# Altium footprint library My Library.PcbLib: 872 footprints (part 47 of 55)
Each footprint in its own frame and in the unit in brackets; x right, y up, seen from the top. Pads: shape width x height; smd on the part's side, far side on the other; paste and mask are expansions set on the pad; w line width, h text height; cw(c..) or ccw(c..) is an arc to the next point about the centre after c.
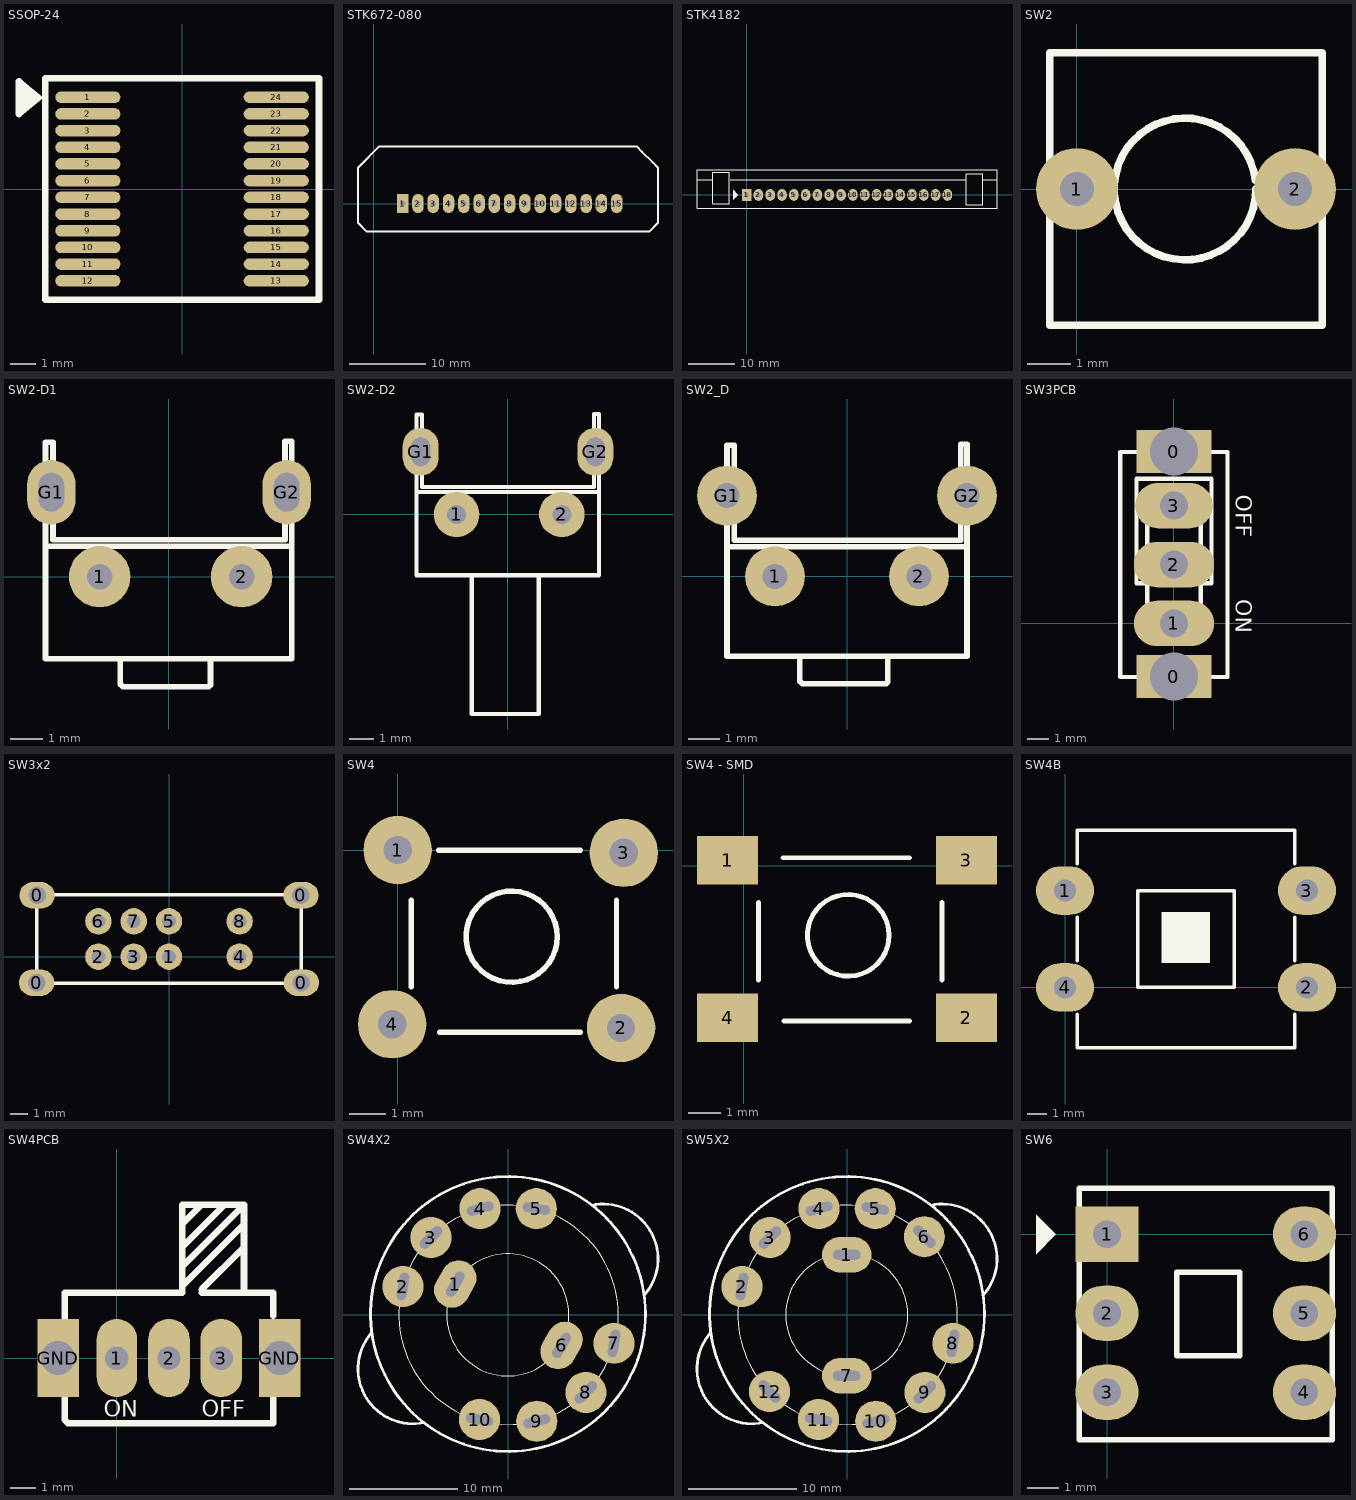
[diagram p46: the footprints below, top view; thin cyan lines are the x and y axes]

## SSOP-24 [mm]
pads (24):
  oval 2.54x0.45 smd: 1(-3.67,3.575) 2(-3.67,2.925) 3(-3.67,2.275) 4(-3.67,1.625) 5(-3.67,0.975) 6(-3.67,0.325) 7(-3.67,-0.325) 8(-3.67,-0.975) 9(-3.67,-1.625) 10(-3.67,-2.275) 11(-3.67,-2.925) 12(-3.67,-3.575) 13(3.67,-3.575) 14(3.67,-2.925) 15(3.67,-2.275) 16(3.67,-1.625) 17(3.67,-0.975) 18(3.67,-0.325) 19(3.67,0.325) 20(3.67,0.975) 21(3.67,1.625) 22(3.67,2.275) 23(3.67,2.925) 24(3.67,3.575)
Top Overlay:
  region: -5.588,3.556 -6.35,4.191 -6.35,2.921
  lines w0.254: -6.35,2.921 -5.588,3.556 -6.35,4.191 -6.35,2.921 ; -5.334,-4.318 5.334,-4.318 5.334,4.318 -5.334,4.318 -5.334,-4.318
3D body: height 2, standoff 0.05, extent -2.8,-4.25 2.8,4.25
3D body: height 1.05, standoff 0.95, extent -3.2,3.384 -2.286,3.765
3D body: height 1.05, standoff 0, extent -3.327,3.384 -3.2,3.765
3D body: height 0.1, standoff 0, extent -4.064,3.384 -3.327,3.765
3D body: height 0.1, standoff 0, extent -4.064,2.734 -3.327,3.115
3D body: height 1.05, standoff 0, extent -3.327,2.734 -3.2,3.115
3D body: height 1.05, standoff 0.95, extent -3.2,2.734 -2.286,3.115
3D body: height 0.1, standoff 0, extent -4.064,2.084 -3.327,2.465
3D body: height 1.05, standoff 0, extent -3.327,2.084 -3.2,2.465
3D body: height 1.05, standoff 0.95, extent -3.2,2.084 -2.286,2.465
3D body: height 0.1, standoff 0, extent -4.064,1.434 -3.327,1.815
3D body: height 1.05, standoff 0, extent -3.327,1.434 -3.2,1.815
3D body: height 1.05, standoff 0.95, extent -3.2,1.434 -2.286,1.815
3D body: height 0.1, standoff 0, extent -4.064,0.784 -3.327,1.165
3D body: height 1.05, standoff 0, extent -3.327,0.784 -3.2,1.165
3D body: height 1.05, standoff 0.95, extent -3.2,0.784 -2.286,1.165
3D body: height 0.1, standoff 0, extent -4.064,0.134 -3.327,0.515
3D body: height 1.05, standoff 0, extent -3.327,0.134 -3.2,0.515
3D body: height 1.05, standoff 0.95, extent -3.2,0.134 -2.286,0.515
3D body: height 0.1, standoff 0, extent -4.064,-0.516 -3.327,-0.135
3D body: height 1.05, standoff 0, extent -3.327,-0.516 -3.2,-0.135
3D body: height 1.05, standoff 0.95, extent -3.2,-0.516 -2.286,-0.135
3D body: height 0.1, standoff 0, extent -4.064,-1.165 -3.327,-0.784
3D body: height 1.05, standoff 0, extent -3.327,-1.165 -3.2,-0.784
3D body: height 1.05, standoff 0.95, extent -3.2,-1.165 -2.286,-0.784
3D body: height 0.1, standoff 0, extent -4.064,-1.816 -3.327,-1.435
3D body: height 1.05, standoff 0, extent -3.327,-1.816 -3.2,-1.435
3D body: height 1.05, standoff 0.95, extent -3.2,-1.816 -2.286,-1.435
3D body: height 0.1, standoff 0, extent -4.064,-2.466 -3.327,-2.085
3D body: height 1.05, standoff 0, extent -3.327,-2.466 -3.2,-2.085
3D body: height 1.05, standoff 0.95, extent -3.2,-2.466 -2.286,-2.085
3D body: height 0.1, standoff 0, extent -4.064,-3.116 -3.327,-2.735
3D body: height 1.05, standoff 0, extent -3.327,-3.116 -3.2,-2.735
3D body: height 1.05, standoff 0.95, extent -3.2,-3.116 -2.286,-2.735
3D body: height 0.1, standoff 0, extent -4.064,-3.765 -3.327,-3.384
3D body: height 1.05, standoff 0, extent -3.327,-3.765 -3.2,-3.384
3D body: height 1.05, standoff 0.95, extent -3.2,-3.765 -2.286,-3.384
3D body: height 1.05, standoff 0.95, extent 2.286,3.384 3.2,3.765
3D body: height 1.05, standoff 0, extent 3.2,3.384 3.327,3.765
3D body: height 0.1, standoff 0, extent 3.327,3.384 4.064,3.765
3D body: height 1.05, standoff 0.95, extent 2.286,2.735 3.2,3.116
3D body: height 1.05, standoff 0, extent 3.2,2.735 3.327,3.116
3D body: height 0.1, standoff 0, extent 3.327,2.735 4.064,3.116
3D body: height 1.05, standoff 0.95, extent 2.286,2.085 3.2,2.466
3D body: height 1.05, standoff 0, extent 3.2,2.085 3.327,2.466
3D body: height 0.1, standoff 0, extent 3.327,2.085 4.064,2.466
3D body: height 1.05, standoff 0.95, extent 2.286,1.435 3.2,1.816
3D body: height 1.05, standoff 0, extent 3.2,1.435 3.327,1.816
3D body: height 0.1, standoff 0, extent 3.327,1.435 4.064,1.816
3D body: height 1.05, standoff 0.95, extent 2.286,0.784 3.2,1.165
3D body: height 1.05, standoff 0, extent 3.2,0.784 3.327,1.165
3D body: height 0.1, standoff 0, extent 3.327,0.784 4.064,1.165
3D body: height 1.05, standoff 0.95, extent 2.286,0.135 3.2,0.516
3D body: height 1.05, standoff 0, extent 3.2,0.135 3.327,0.516
3D body: height 0.1, standoff 0, extent 3.327,0.135 4.064,0.516
3D body: height 1.05, standoff 0.95, extent 2.286,-0.515 3.2,-0.134
3D body: height 1.05, standoff 0, extent 3.2,-0.515 3.327,-0.134
3D body: height 0.1, standoff 0, extent 3.327,-0.515 4.064,-0.134
3D body: height 1.05, standoff 0.95, extent 2.286,-1.165 3.2,-0.784
3D body: height 1.05, standoff 0, extent 3.2,-1.165 3.327,-0.784
3D body: height 0.1, standoff 0, extent 3.327,-1.165 4.064,-0.784
3D body: height 1.05, standoff 0.95, extent 2.286,-1.815 3.2,-1.434
3D body: height 1.05, standoff 0, extent 3.2,-1.815 3.327,-1.434
3D body: height 0.1, standoff 0, extent 3.327,-1.815 4.064,-1.434
3D body: height 1.05, standoff 0.95, extent 2.286,-2.465 3.2,-2.084
3D body: height 1.05, standoff 0, extent 3.2,-2.465 3.327,-2.084
3D body: height 0.1, standoff 0, extent 3.327,-2.465 4.064,-2.084
3D body: height 1.05, standoff 0.95, extent 2.286,-3.115 3.2,-2.734
3D body: height 1.05, standoff 0, extent 3.2,-3.115 3.327,-2.734
3D body: height 0.1, standoff 0, extent 3.327,-3.115 4.064,-2.734
3D body: height 0.1, standoff 0, extent 3.327,-3.765 4.064,-3.384
3D body: height 1.05, standoff 0, extent 3.2,-3.765 3.327,-3.384
3D body: height 1.05, standoff 0.95, extent 2.286,-3.765 3.2,-3.384
3D body: height 2.01, standoff 0, extent -2.304,3.036 -1.286,4.054

## STK672-080 [mm]
pads (15):
  rect 1.5x2.5 / inner rect 1.2x2.5 / far side rect 1.5x2.5 hole 0.7: 1(3.81,0)
  oval 1.5x2.5 / inner oval 1.2x2.5 / far side oval 1.5x2.5 hole 0.7: 2(5.81,0) 3(7.81,0) 4(9.81,0) 5(11.81,0) 6(13.81,0) 7(15.81,0) 8(17.81,0) 9(19.81,0) 10(21.81,0) 11(23.81,0) 12(25.81,0) 13(27.81,0) 14(29.81,0) 15(31.81,0)
Top Overlay:
  lines w0.254: -2.032,-2.54 -0.889,-3.683 36.068,-3.683 37.211,-2.54 37.211,4.699 36.512,5.397 35.115,6.794 34.417,7.493 0.762,7.493 -2.032,4.699 -2.032,-2.54

## STK4182 [mil] "Pin to pin 100mil, 18 pin"
pads (18):
  rect 80x100 hole 40: 1(0,0)
  oval 80x100 hole 40: 2(100,0) 3(200,0) 4(300,0) 5(400,0) 6(500,0) 7(600,0) 8(700,0) 9(800,0) 10(900,0) 11(1000,0) 12(1100,0) 13(1200,0) 14(1300,0) 15(1400,0) 16(1500,0) 17(1600,0) 18(1700,0)
Top Overlay:
  region: -115,42.5 -115,-42.5 -75,-2.5 -75,2.5
  lines w10: -420,130 -285,130 ; -140,130 1860,130 ; 2000,130 2120,130 ; -420,-115 -420,215 2120,215 2120,-115 -420,-115 ; -285,-75 -145,-75 -145,190 -285,190 -285,-75 ; 1860,-85 1860,180 2000,180 2000,-85 1860,-85

## SW2 [mil] "SW button 2pin, 250x 250 mil"
height 100
pads (2):
  round 75 hole 31: 1(0,0) 2(200,0)
Top Overlay:
  lines w7: 163.64,8.26 ccw(c99.17,0) 164.17,0 ; -25,-125 225,-125 225,125 -25,125 -25,-125

## SW2-D1 [mil] "SW button 2pin, 300x 300 x 250 mil"
height 100
pads (4):
  round 75 hole 31: 1(-84,0) 2(89,0)
  oval 59.06x78.74 hole 31 slot 47.24 at 90 deg: G1(-143,103) G2(144,103)
Top Overlay:
  lines w7: -150,37 150,37 ; -59,-100 -59,-131 -56,-134 49,-134 51,-132 51,-100 ; -150,-100 -150,164 -141,164 -141,45 142,45 142,165 150,165 150,-100 -150,-100
3D body "19950.stp": height 291.34, standoff -137.8, extent -170.26,-123 172.26,158.5

## SW2-D2 [mil] "SW button 2pin, 300x 300 x 250 mil"
height 100
pads (4):
  round 75 hole 31: 1(-84,0) 2(89,0)
  oval 59.06x78.74 hole 31 slot 47.24 at 90 deg: G1(-143,103) G2(144,103)
Top Overlay:
  lines w7: -150,37 150,37 ; -59,-100 -59,-328 51,-328 51,-100 ; -150,-100 150,-100 150,165 142,165 142,45 -141,45 -141,164 -150,164 -150,-100
3D body "SW3dPS-Alps TACT SKHH Horizontal Switch.STEP": height 290.35, standoff -137.8, extent -162.52,-327.46 166.72,163.49

## SW2_D [mil] "SW button 2pin, 300x 300 x 250 mil"
height 100
pads (4):
  round 75 hole 31: 1(-90,0) 2(90,0) G1(-150,101) G2(150,101)
Top Overlay:
  lines w7: -150,37 150,37 ; -59,-100 -59,-131 -56,-134 49,-134 51,-132 51,-100 ; -150,-100 150,-100 150,165 142,165 142,45 -141,45 -141,164 -150,164 -150,-100

## SW3PCB [mil]
pads (5):
  rect 140x80 hole 90: 0(0,-99) 0(0,321)
  oval 150x85 hole 52: 1(0,0) 2(0,110)
  oval 145x85 hole 52: 3(0,220)
Top Overlay:
  lines w8: -70,90 70,90 ; -70,120 65,120 ; -65,105 70,105 ; -50,0 -50,220 50,220 50,0 ; -50,0 50,0 ; -50,0 50,0 ; -100,-100 -100,320 100,320 100,-100 -100,-100 ; -70,75 -70,270 70,270 70,75 -70,75
  text "OFF" at 115,240 h30
  text "ON" at 115,45 h30

## SW3x2 [mil] "Switch 3x2 - pin to pin 80"
height 500
pads (12):
  oval 80x60 hole 40: 0(-300,-59) 0(-299,139) 0(299,139) 0(300,-59)
  round 60 hole 31: 1(0,0) 2(-160,0) 3(-80,0) 4(160,0) 5(0,80) 6(-160,80) 7(-80,80) 8(160,80)
Top Overlay:
  lines w8: -300,-60 -300,140 300,140 300,-60 -300,-60

## SW4 [mil] "SW button 4pin, 250 x250 mil"
height 100
pads (4):
  round 75 hole 31: 1(0,0) 2(245,-195) 3(248,-3) 4(-6,-191)
Top Overlay:
  circle w6: c125,-95 r50
  lines w6: 15,-150 15,-55 ; 45,0 200,0 ; 46,-200 200,-200 ; 240,-150 240,-55
  lines w7: 239,-215 240,-214
3D body "SW3dPS-.STEP": height 275.59, standoff -137.8, extent -35.51,-220 275.51,24.09

## SW4 - SMD [mm] "SW button 4pin, 250 x250 mil"
height 2.54
pads (4):
  rect 1.905x1.5 smd: 1(-0.5,0.178) 2(6.926,-4.724) 3(6.926,0.178) 4(-0.5,-4.724)
Top Overlay:
  circle w0.152: c3.251,-2.159 r1.27
  lines w0.152: 0.457,-3.556 0.457,-1.143 ; 1.219,0.254 5.156,0.254 ; 1.245,-4.826 5.156,-4.826 ; 6.172,-3.556 6.172,-1.143
  lines w0.178: 6.147,-5.207 6.172,-5.182
3D body "SW3dPS-.STEP": height 7, standoff -3.5, extent -0.826,-5.334 7.074,0.866

## SW4B [mil] "SW button 4pin, 450 x 450 mil"
height 100
pads (4):
  oval 120x100 hole 45: 1(0,200) 2(500,0) 3(500,200) 4(0,0)
Top Overlay:
  rectangle: 199,50 300,156
  lines w7: 25,-55 25,-125 475,-125 475,-55 ; 25,55 25,145 ; 25,255 25,325 475,325 475,255 ; 475,55 475,145 ; 150,0 150,200 350,200 350,0 150,0
3D body "SW3dPS-omron b3w-4000 switch.STEP": height 169.29, standoff -57.09, extent -3.21,-129.22 469.23,343.23

## SW4PCB [mil]
pads (5):
  oval 62x120 hole 36: 1(0,0)
  oval 64x120 hole 36: 2(80,0) 3(160,0)
  rect 64x120 hole 52: GND(-90,0) GND(250,0)
Top Overlay:
  lines w10: -80,-60 -80,-95 -75,-100 240,-100 240,-60 ; -80,60 -80,100 100,100 100,195 ; 100,110 195,205 ; 100,140 190,230 195,230 ; 100,160 100,170 165,235 170,235 ; 130,100 195,100 ; 130,105 195,170 ; 130,235 100,205 100,195 ; 240,65 240,100 195,100 ; 100,195 100,235 195,235 195,195 195,100
  text "ON" at -20,-90 h25
  text "OFF" at 130,-90 h25

## SW4X2 [mil] "Switch 4x2"
height 500
pads (10):
  oval 180x130 hole 35 slot 100 at 60 deg rot 60: 1(-193.57,112.51) 6(193.7,-111.07)
  round 150 hole 35 slot 100 at 80 deg: 2(-384.48,103.48) 7(384.48,-103.48)
  round 150 hole 35 slot 100 at 45 deg: 3(-282.26,282.26) 8(282.26,-282.26)
  round 150 hole 35 slot 100 at 15 deg: 4(-103.48,387.48) 9(103.48,-387.48)
  round 150 hole 35 slot 100 at 170 deg: 5(101.54,387.46) 10(-105.2,-381.27)
Top Overlay:
  circle w10: c-1.46,3.46 r501
  circle w1: c0.54,0.46 r400
  circle w1: c-2.46,0.46 r222.5
  lines w10: -498,-63.94 ccw(c-348.29,-196.56) -307.65,-392.38 ; 303.52,399.93 cw(c345.18,204.32) 495.11,71.95

## SW5X2 [mil] "Switch 5x2"
height 500
pads (12):
  oval 180x130 hole 35 slot 100 at 0 deg: 1(-2.46,219.46) 7(-2.46,-221.54)
  round 150 hole 35 slot 100 at 80 deg: 2(-384.48,103.48) 8(384.48,-103.48)
  round 150 hole 35 slot 100 at 45 deg: 3(-282.26,282.26) 9(282.26,-282.26)
  round 150 hole 35 slot 100 at 15 deg: 4(-103.48,387.48) 10(103.48,-387.48)
  round 150 hole 35 slot 100 at 170 deg: 5(101.54,387.46) 11(-105.2,-381.27)
  round 150 hole 35 slot 100 at 135 deg: 6(280.32,285.24) 12(-283.98,-279.05)
Top Overlay:
  circle w10: c-1.46,3.46 r501
  circle w1: c0.54,0.46 r400
  circle w1: c-2.46,0.46 r222.5
  lines w10: -498,-63.94 ccw(c-348.29,-196.56) -307.65,-392.38 ; 303.52,399.93 cw(c345.18,204.32) 495.11,71.95

## SW6 [mil] "SW DTDP - 6Pin 260x300x300 mil"
pads (6):
  rect 80x70 hole 35: 1(0,0)
  oval 80x70 hole 35: 2(0,-100) 3(0,-200) 4(250,-200) 5(250,-100) 6(250,0)
Top Overlay:
  region: -90,25 -65,0 -90,-25
  lines w7: -35,-260 285,-260 285,58 -35,58 -35,-260 ; 88,-154 168,-154 168,-48 88,-48 88,-154
3D body "User Library-PSM1-0-0.STEP": height 532.1, standoff -137.19, extent -33.48,-259.48 281.48,55.49